# Altium footprint library ZYF_IC.PcbLib: 42 footprints (part 3 of 3)
Each footprint in its own frame and in the unit in brackets; x right, y up, seen from the top. Pads: shape width x height; smd on the part's side, far side on the other; paste and mask are expansions set on the pad; w line width, h text height; cw(c..) or ccw(c..) is an arc to the next point about the centre after c.
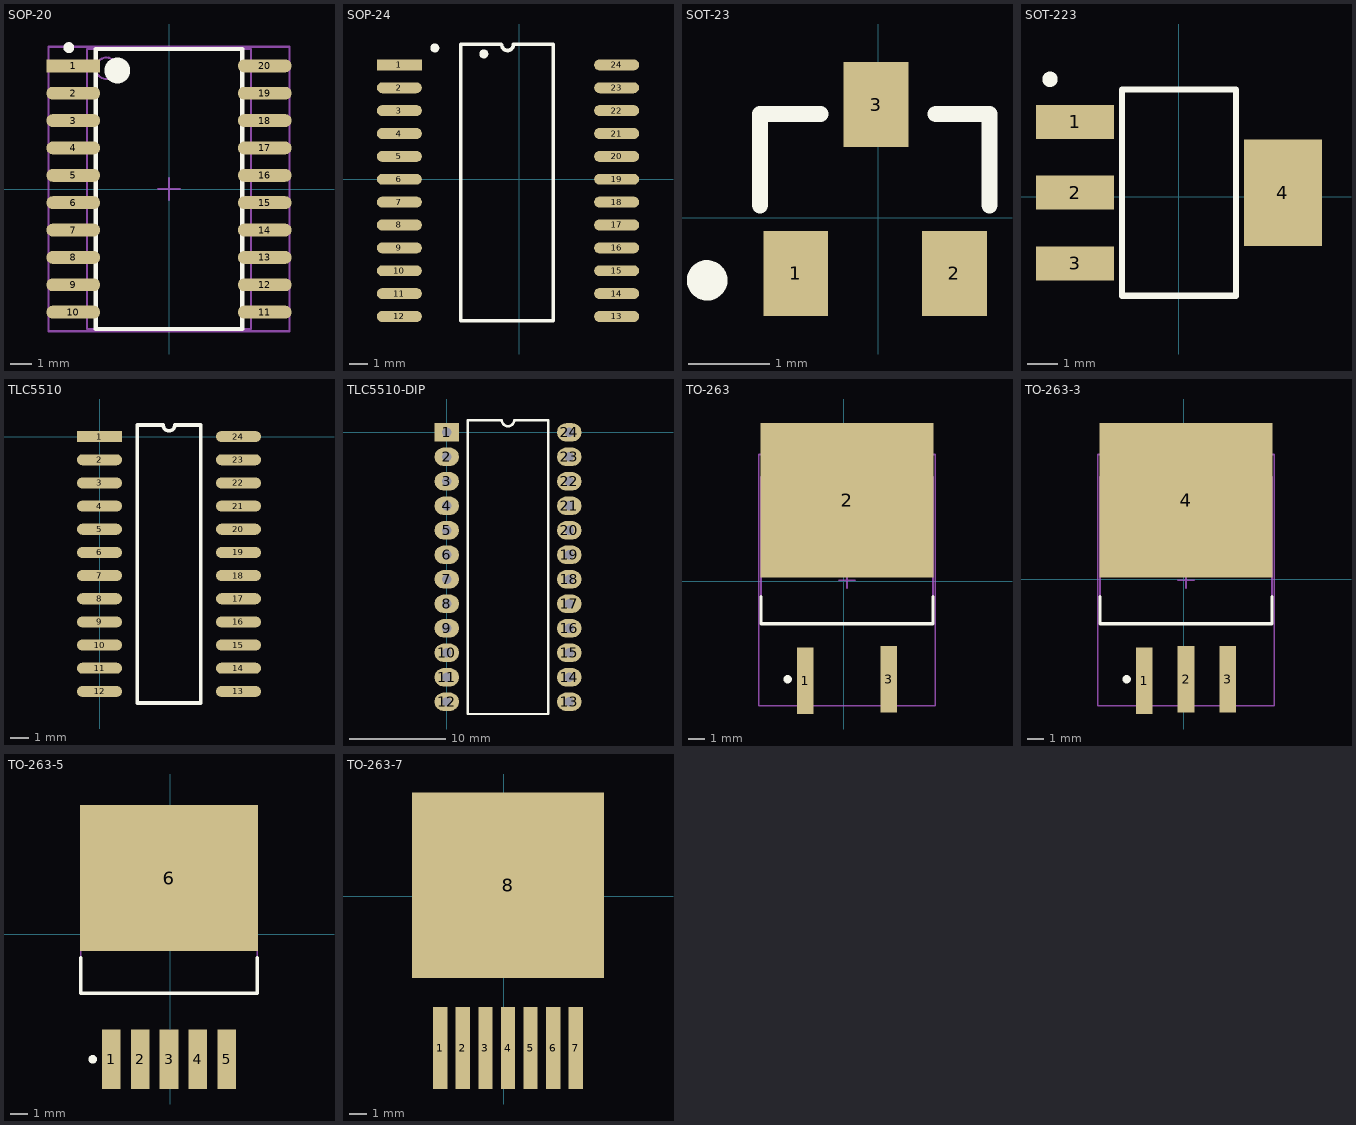
[diagram p2: the footprints below, top view; thin cyan lines are the x and y axes]

## SOP-20 [mm]
pads (20):
  rect 2.495x0.6 smd: 1(-4.445,5.715)
  oval 2.495x0.6 smd: 2(-4.445,4.445) 3(-4.445,3.175) 4(-4.445,1.905) 5(-4.445,0.635) 6(-4.445,-0.635) 7(-4.445,-1.905) 8(-4.445,-3.175) 9(-4.445,-4.445) 10(-4.445,-5.715) 11(4.445,-5.715) 12(4.445,-4.445) 13(4.445,-3.175) 14(4.445,-1.905) 15(4.445,-0.635) 16(4.445,0.635) 17(4.445,1.905) 18(4.445,3.175) 19(4.445,4.445) 20(4.445,5.715)
Top Overlay:
  circle w0.25: c-4.65,6.565 r0.125
  circle w0.6: c-2.4,5.5 r0.3
  lines w0.2: -3.4,-6.5 -3.4,6.5 3.4,6.5 3.4,-6.5 -3.4,-6.5
Mechanical 13:
  circle w0.1: c-2.9,5.6 r0.5
  lines w0.1: -3.8,-6.5 -3.8,6.5 3.8,6.5 3.8,-6.5 -3.8,-6.5
Mechanical 15:
  lines w0.1: -0.5,0 0.5,0 ; 0,-0.5 0,0.5 ; -5.6,-6.6 -5.6,6.6 5.6,6.6 5.6,-6.6 -5.6,-6.6
3D body: height 2, standoff 0, extent -4.05,-6.35 4.05,6.35

## SOP-24 [mil]
pads (24):
  rect 98.43x24 smd: 1(-262.5,250)
  oval 98.43x24 smd: 2(-262.5,200) 3(-262.5,150) 4(-262.5,100) 5(-262.5,50) 6(-262.5,0) 7(-262.5,-50) 8(-262.5,-100) 9(-262.5,-150) 10(-262.5,-200) 11(-262.5,-250) 12(-262.5,-300) 13(212.5,-300) 14(212.5,-250) 15(212.5,-200) 16(212.5,-150) 17(212.5,-100) 18(212.5,-50) 19(212.5,0) 20(212.5,50) 21(212.5,100) 22(212.5,150) 23(212.5,200) 24(212.5,250)
Top Overlay:
  circle w9.84: c-185,287 r4.92
  circle w9.84: c-77.92,274 r4.92
  lines w7.87: -40,295.2 -79.1,295.2 -128,295.2 -128,-309.53 74,-309.53 74,295.2 -13,295.2 ; -38.6,294 ccw(c-26,294) -13.4,294
3D body: height 80, standoff 6.26, extent -233.01,-334 179,284

## SOT-23 [mil]
pads (3):
  rect 31.5x41.34 smd: 1(-40,-27) 2(37,-27) 3(-1,55)
Top Overlay:
  circle w9.84: c-82.99,-30.35 r4.92
  lines w7.87: -57.4,6.06 -57.4,50.35 -28,50.35 ; 28,50.35 54,50.35 54,6.06
3D body: height 43.31, standoff 0, extent -60.05,-35 58.06,65.07

## SOT-223 [mm]
pads (4):
  rect 2.54x1.1 smd: 1(-3.375,2.427) 2(-3.375,0.127) 3(-3.375,-2.173)
  rect 2.54x3.45 smd: 4(3.375,0.127)
Top Overlay:
  circle w0.25: c-4.189,3.81 r0.125
  lines w0.2: -1.85,-3.223 -1.85,3.477 1.85,3.477 1.85,-3.223 -1.85,-3.223
3D body: height 1.66, standoff -0.02, extent -3.48,-3.123 3.48,3.377

## TLC5510 [mm]
pads (24):
  rect 2.5x0.61 smd: 1(0,0)
  oval 2.5x0.61 smd: 2(0,-1.28) 3(0,-2.56) 4(0,-3.84) 5(0,-5.12) 6(0,-6.4) 7(0,-7.68) 8(0,-8.96) 9(0,-10.24) 10(0,-11.52) 11(0,-12.8) 12(0,-14.08) 13(7.68,-14.08) 14(7.68,-12.8) 15(7.68,-11.52) 16(7.68,-10.24) 17(7.68,-8.96) 18(7.68,-7.68) 19(7.68,-6.4) 20(7.68,-5.12) 21(7.68,-3.84) 22(7.68,-2.56) 23(7.68,-1.28) 24(7.68,0)
Top Overlay:
  lines w0.2: 2.085,-14.72 5.595,-14.72 5.595,0.64 4.16,0.64 cw(c3.84,0.64) 3.52,0.64 2.085,0.64 2.085,-14.72

## TLC5510-DIP [mil]
pads (24):
  rect 100x75 hole 39: 1(0,0)
  oval 100x75 hole 39: 2(0,-100) 3(0,-200) 4(0,-300) 5(0,-400) 6(0,-500) 7(0,-600) 8(0,-700) 9(0,-800) 10(0,-900) 11(0,-1000) 12(0,-1100) 13(500,-1100) 14(500,-1000) 15(500,-900) 16(500,-800) 17(500,-700) 18(500,-600) 19(500,-500) 20(500,-400) 21(500,-300) 22(500,-200) 23(500,-100) 24(500,0)
Top Overlay:
  lines w10: 85,-1150 415,-1150 415,50 275,50 cw(c250,50) 225,50 85,50 85,-1150

## TO-263 [mil]
pads (3):
  rect 39.37x158 smd: 1(-92.5,-237.5) 3(107.5,-233.72)
  rect 411.42x368 smd: 2(7.5,192.5)
Top Overlay:
  circle w9.84: c-133.84,-233.72 r4.92
  lines w7.87: -197.22,-36.87 -197.22,-101.83 212.22,-101.83 212.22,-36.87
Mechanical 13:
  lines w3.94: -197.22,-101.83 212.22,-101.83 212.22,248.17 -197.22,248.17 -197.22,-101.83
Mechanical 15:
  lines w3.94: -12.19,2.5 27.18,2.5 ; 7.5,-17.18 7.5,22.18 ; -203.13,-296.71 218.13,-296.71 218.13,301.71 -203.13,301.71 -203.13,-296.71
3D body: height 193.9, standoff -3.66, extent -194.99,-265.71 205.01,335.23

## TO-263-3 [mil]
pads (4):
  rect 39.37x158 smd: 1(-95,-242.5) 2(5,-238.72) 3(105,-238.72)
  rect 411.42x368 smd: 4(5,187.5)
Top Overlay:
  circle w9.84: c-136.34,-238.72 r4.92
  lines w7.87: -199.72,-41.87 -199.72,-106.83 209.72,-106.83 209.72,-41.87
Mechanical 13:
  lines w3.94: -199.72,-106.83 209.72,-106.83 209.72,243.17 -199.72,243.17 -199.72,-106.83
Mechanical 15:
  lines w3.94: -14.69,-2.5 24.68,-2.5 ; 5,-22.18 5,17.18 ; -205.63,-301.71 215.63,-301.71 215.63,296.71 -205.63,296.71 -205.63,-301.71
3D body: height 184.65, standoff 0, extent -195,-265.37 205,342.5

## TO-263-5 [mm]
pads (6):
  rect 1.1x3.5 smd: 1(-3.464,-7.384) 2(-1.764,-7.384) 3(-0.064,-7.384) 4(1.636,-7.384) 5(3.336,-7.384)
  rect 10.5x8.6 smd: 6(-0.064,3.31)
Top Overlay:
  circle w0.25: c-4.564,-7.384 r0.125
  lines w0.2: -5.263,-1.391 -5.263,-3.49 5.136,-3.49 5.136,-1.391
Mechanical 13:
  lines w0.1: -5.263,-3.49 5.136,-3.49 5.136,5.91 -5.263,5.91 -5.263,-3.49
Mechanical 15:
  lines w0.1: -0.564,-0.191 0.436,-0.191 ; -0.064,-0.69 -0.064,0.31
3D body: height 4.56, standoff 0, extent -5.144,-7.475 5.016,6.54

## TO-263-7 [mil]
pads (8):
  rect 31.5x181.1 smd: 1(-141,-336) 2(-91,-336) 3(-41,-336) 4(9,-336) 5(59,-336) 6(109,-336) 7(159,-336)
  rect 425.2x410 smd: 8(9,24)
3D body: height 175.3, standoff -13.67, extent -187.85,-398 205.85,218.93